# Altium footprint library DIP Component.PcbLib: 327 footprints (part 7 of 21)
Each footprint in its own frame and in the unit in brackets; x right, y up, seen from the top. Pads: shape width x height; smd on the part's side, far side on the other; paste and mask are expansions set on the pad; w line width, h text height; cw(c..) or ccw(c..) is an arc to the next point about the centre after c.
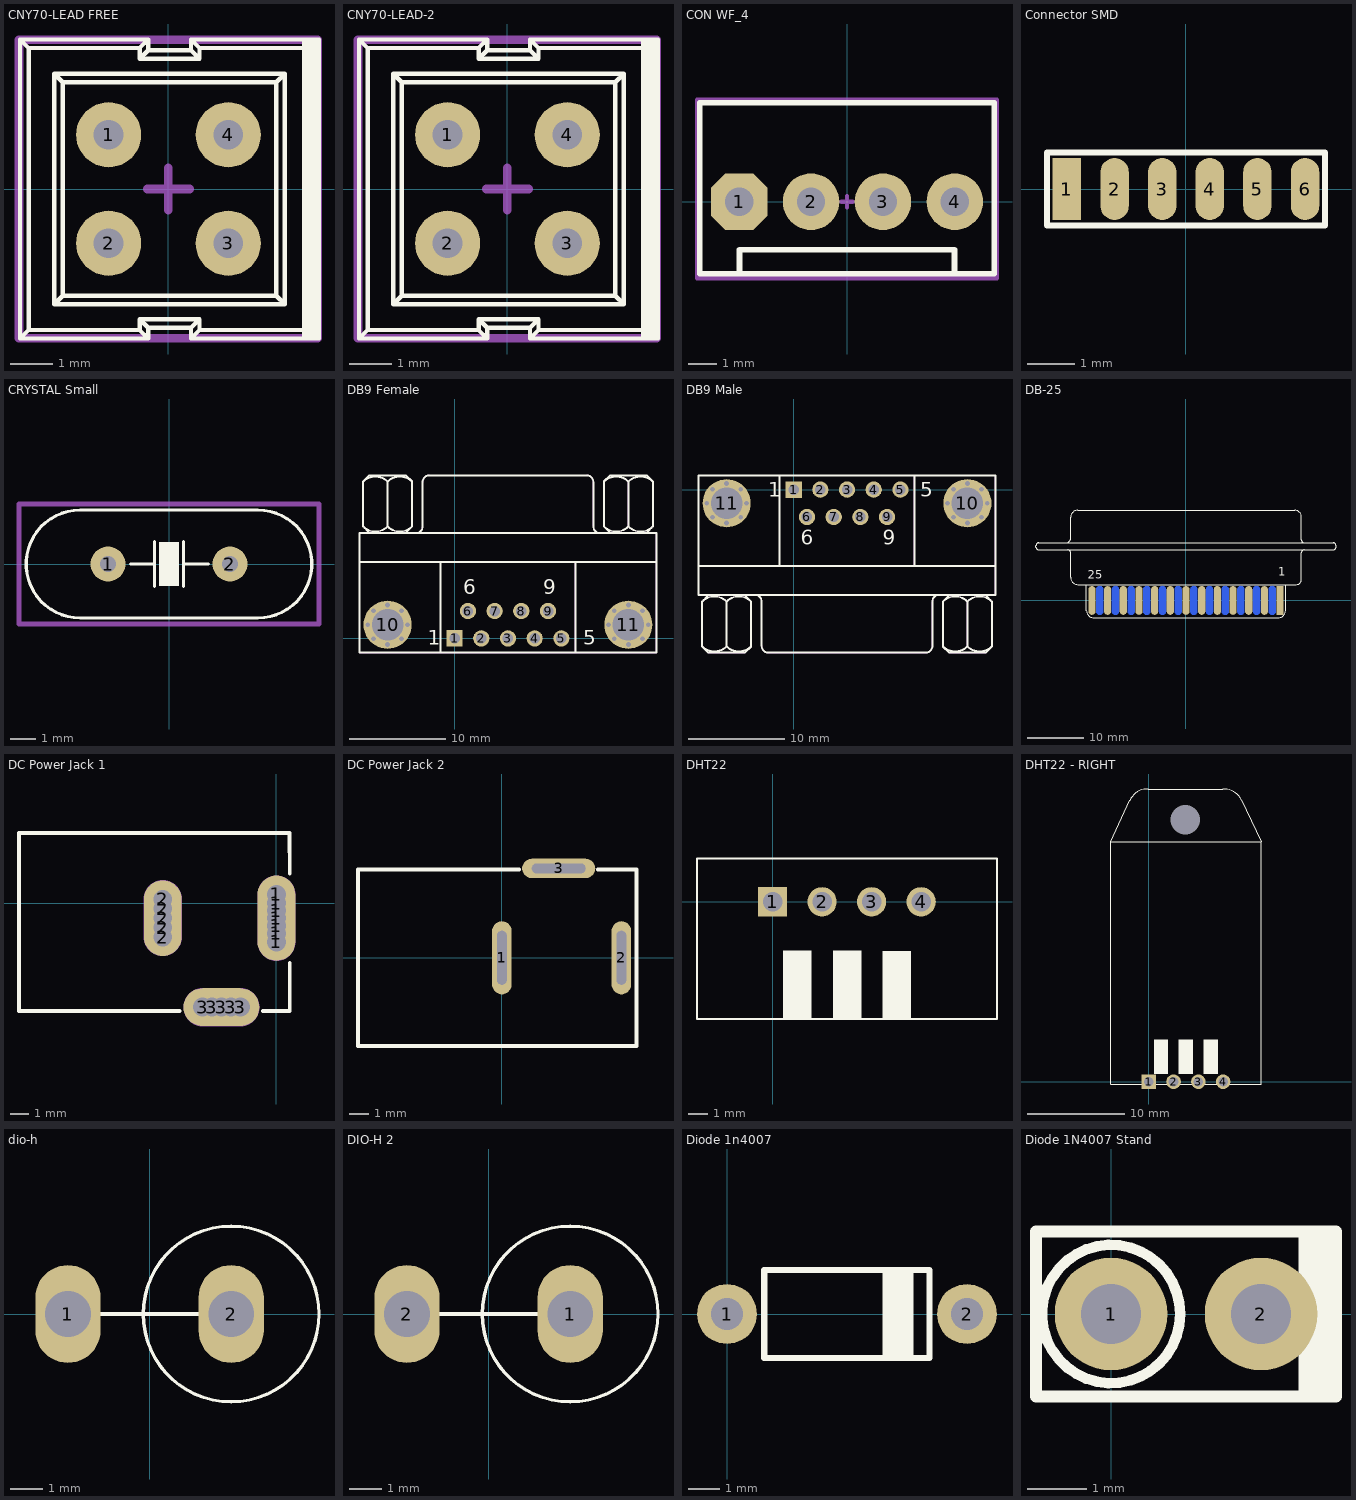
[diagram p6: the footprints below, top view; thin cyan lines are the x and y axes]

## CNY70-LEAD FREE [mm] "Dimensions (L x W x H in mm): 7 x 7 x 6  • Peak operating distance: < 0.5 mm DESIGNER ABBAS BASEREH"
height 6
pads (4):
  round 1.524 hole 0.7: 1(-1.4,1.27) 2(-1.4,-1.27) 3(1.4,-1.27) 4(1.4,1.27)
Top Overlay:
  rectangle: 3.125,-3.5 3.525,3.5
  lines w0.1: -3.475,-3.5 -0.475,-3.5 ; -3.475,-3.5 -3.275,-3.3 ; -3.475,-3.5 -3.475,3.5 ; -3.475,3.5 -3.275,3.3 ; -3.475,3.5 -0.475,3.5 ; -3.275,-3.3 -0.675,-3.3 ; -3.275,-3.3 -3.275,3.3 ; -3.275,3.3 -0.675,3.3 ; -2.675,-2.7 -2.475,-2.5 ; -2.675,-2.7 -2.675,2.7 ; -2.675,-2.7 2.725,-2.7 ; -2.675,2.7 -2.475,2.5 ; -2.675,2.7 2.725,2.7 ; -2.475,-2.5 -2.475,2.5 ; -2.475,-2.5 2.525,-2.5 ; -2.475,2.5 2.525,2.5 ; -0.675,-3.3 -0.675,-3.05 ; -0.675,-3.3 -0.475,-3.5 ; -0.675,-3.05 0.725,-3.05 ; -0.675,-3.05 -0.475,-3.25 ; -0.675,3.05 0.725,3.05 ; -0.675,3.05 -0.675,3.3 ; -0.675,3.05 -0.475,3.25 ; -0.675,3.3 -0.475,3.5 ; -0.475,-3.5 -0.475,-3.25 ; -0.475,-3.25 0.525,-3.25 ; -0.475,3.25 0.525,3.25 ; -0.475,3.25 -0.475,3.5 ; 0.525,-3.5 3.525,-3.5 ; 0.525,-3.5 0.725,-3.3 ; 0.525,-3.5 0.525,-3.25 ; 0.525,-3.25 0.725,-3.05 ; 0.525,3.25 0.725,3.05 ; 0.525,3.25 0.525,3.5 ; 0.525,3.5 0.725,3.3 ; 0.525,3.5 3.525,3.5 ; 0.725,-3.3 3.325,-3.3 ; 0.725,-3.3 0.725,-3.05 ; 0.725,3.05 0.725,3.3 ; 0.725,3.3 3.325,3.3 ; 2.525,-2.5 2.725,-2.7 ; 2.525,-2.5 2.525,2.5 ; 2.525,2.5 2.725,2.7 ; 2.725,-2.7 2.725,2.7 ; 3.325,-3.3 3.525,-3.5 ; 3.325,-3.3 3.325,3.3 ; 3.325,3.3 3.525,3.5 ; 3.525,-3.5 3.525,3.5
Mechanical 15:
  lines w0.2: -0.5,0 0.5,0 ; 0,-0.5 0,0.5 ; -3.5,-3.5 -3.5,3.5 3.5,3.5 3.5,-3.5 -3.5,-3.5
3D body "CNY70.STEP": height 6.01, standoff 0.01, extent -3.475,-3.5 3.525,3.5

## CNY70-LEAD-2 [mm] "Dimensions (L x W x H in mm): 7 x 7 x 6  • Peak operating distance: < 0.5 mm DESIGNER ABBAS BASEREH"
height 6
pads (4):
  round 1.524 hole 0.7: 1(-1.4,1.27) 2(-1.4,-1.27) 3(1.4,-1.27) 4(1.4,1.27)
Top Overlay:
  rectangle: 3.125,-3.5 3.525,3.5
  lines w0.1: -3.475,-3.5 -0.475,-3.5 ; -3.475,-3.5 -3.275,-3.3 ; -3.475,-3.5 -3.475,3.5 ; -3.475,3.5 -3.275,3.3 ; -3.475,3.5 -0.475,3.5 ; -3.275,-3.3 -0.675,-3.3 ; -3.275,-3.3 -3.275,3.3 ; -3.275,3.3 -0.675,3.3 ; -2.675,-2.7 -2.475,-2.5 ; -2.675,-2.7 -2.675,2.7 ; -2.675,-2.7 2.725,-2.7 ; -2.675,2.7 -2.475,2.5 ; -2.675,2.7 2.725,2.7 ; -2.475,-2.5 -2.475,2.5 ; -2.475,-2.5 2.525,-2.5 ; -2.475,2.5 2.525,2.5 ; -0.675,-3.3 -0.675,-3.05 ; -0.675,-3.3 -0.475,-3.5 ; -0.675,-3.05 0.725,-3.05 ; -0.675,-3.05 -0.475,-3.25 ; -0.675,3.05 0.725,3.05 ; -0.675,3.05 -0.675,3.3 ; -0.675,3.05 -0.475,3.25 ; -0.675,3.3 -0.475,3.5 ; -0.475,-3.5 -0.475,-3.25 ; -0.475,-3.25 0.525,-3.25 ; -0.475,3.25 0.525,3.25 ; -0.475,3.25 -0.475,3.5 ; 0.525,-3.5 3.525,-3.5 ; 0.525,-3.5 0.725,-3.3 ; 0.525,-3.5 0.525,-3.25 ; 0.525,-3.25 0.725,-3.05 ; 0.525,3.25 0.725,3.05 ; 0.525,3.25 0.525,3.5 ; 0.525,3.5 0.725,3.3 ; 0.525,3.5 3.525,3.5 ; 0.725,-3.3 3.325,-3.3 ; 0.725,-3.3 0.725,-3.05 ; 0.725,3.05 0.725,3.3 ; 0.725,3.3 3.325,3.3 ; 2.525,-2.5 2.725,-2.7 ; 2.525,-2.5 2.525,2.5 ; 2.525,2.5 2.725,2.7 ; 2.725,-2.7 2.725,2.7 ; 3.325,-3.3 3.525,-3.5 ; 3.325,-3.3 3.325,3.3 ; 3.325,3.3 3.525,3.5 ; 3.525,-3.5 3.525,3.5
Mechanical 15:
  lines w0.2: -0.5,0 0.5,0 ; 0,-0.5 0,0.5 ; -3.5,-3.5 -3.5,3.5 3.5,3.5 3.5,-3.5 -3.5,-3.5
3D body "CNY70.SLDPRT": height 6, standoff -6.75, extent -3.15,-3.15 3.15,3.15

## CON WF_4 [mm] "DS1070  WF, Cvilux CI31 pitch 2.54mm-Designer Abbas Basereh"
pads (4):
  oct 2x2 hole 1: 1(-3.81,0)
  round 2 hole 1: 2(-1.27,0) 3(1.27,0) 4(3.81,0)
Top Overlay:
  lines w0.2: -3.8,-2.548 -3.8,-1.7 3.8,-1.7 3.8,-2.548 ; -5.2,-2.548 -5.2,3.5 5.2,3.5 5.2,-2.548 -5.2,-2.548
Mechanical 15:
  lines w0.15: -0.2,0 0.2,0 ; 0,-0.2 0,0.2 ; -5.3,-2.7 -5.3,3.6 5.3,3.6 5.3,-2.7 -5.3,-2.7
3D body "User Library-CI31_4.step": height 11.56, standoff -3.24, extent -5.08,-2.402 5.08,3.398

## Connector SMD [mm]
pads (6):
  rect 0.6x1.3 smd: 1(-2.5,0)
  oval 0.6x1.3 smd: 2(-1.5,0) 3(-0.5,0) 4(0.5,0) 5(1.5,0) 6(2.5,0)
Top Overlay:
  lines w0.127: -2.921,-0.762 -2.921,0.762 2.921,0.762 2.921,-0.762 -2.921,-0.762

## CRYSTAL Small [mil] "DESIGNER ABBAS BASEREH"
height 157.48
pads (2):
  round 55 hole 25: 1(-96.06,0) 2(96.06,0)
Top Overlay:
  rectangle: -15.75,-35 15.75,35
  lines w5: -60.87,0 -22.87,0 ; -22.87,-35 -22.87,35 ; 22.87,-35 22.87,35 ; 22.87,0 61.87,0 ; -140,-85 cw(c-140,0) -140,85 140,85 cw(c140,0) 140,-85 -140,-85
Mechanical 15:
  lines w7.87: -7.87,0 7.87,0 ; 0,-7.87 0,7.87 ; -236.22,-94.49 236.22,-94.49 236.22,94.49 -236.22,94.49 -236.22,-94.49
3D body "Crystal-3.8mm.STEP": height 142.13, standoff -76.77, extent -226.37,-88.58 226.38,88.59

## DB9 Female [mm] "Connector; D Subminiature AMPLIMITE 2000; 9 Position; Right Angle"
height 12.75
pads (27):
  rect 1.69x1.69 hole 1.09: 1(0,0)
  round 1.69 hole 1.09: 2(2.77,0) 3(5.54,0) 4(8.31,0) 5(11.08,0) 6(1.385,2.84) 7(4.155,2.84) 8(6.925,2.84) 9(9.695,2.84)
  round 0.8 hole 0.5: 10(-9.015,1.42) 10(-8.412,-0.037) 10(-8.412,2.877) 10(-6.955,-0.64) 10(-6.955,3.48) 10(-5.498,-0.037) 10(-5.498,2.877) 10(-4.895,1.42) 11(15.975,1.42) 11(16.578,-0.037) 11(16.578,2.877) 11(18.035,-0.64) 11(18.035,3.48) 11(19.492,-0.037) 11(19.492,2.877) 11(20.095,1.42)
  round 5 hole 3.26: 10(-6.955,1.42) 11(18.035,1.42)
Top Overlay:
  lines w0.2: -9.86,7.92 20.94,7.92 ; -9.498,16.27 -9.498,11.619 -8.863,10.984 ; -9.498,16.285 -8.863,16.92 -5.053,16.92 -4.418,16.285 ; -6.958,11.619 -6.958,16.27 ; -5.053,10.984 -4.418,11.619 -4.418,16.27 ; -4.418,15.006 -4.418,15.218 ; -4.02,10.925 ccw(c-4.02,11.62) -3.325,11.62 -3.325,16.22 ; -3.32,16.225 cw(c-2.625,16.225) -2.625,16.92 13.705,16.92 cw(c13.705,16.225) 14.4,16.225 ; -1.46,-1.48 -1.46,7.92 ; 12.54,-1.48 12.54,7.92 ; 14.405,16.22 14.405,11.62 ccw(c15.1,11.62) 15.1,10.925 ; 15.502,16.27 15.502,11.619 16.137,10.984 ; 15.502,16.285 16.137,16.92 19.947,16.92 20.582,16.285 ; 18.042,11.619 18.042,16.27 ; 19.947,10.984 20.582,11.619 20.582,16.27 ; 20.582,15.006 20.582,15.218 ; -9.86,-1.48 -9.86,10.92 20.94,10.92 20.94,-1.48 -9.86,-1.48
  lines w0.203: -9.5,11.617 ccw(c-8.228,12.889) -6.956,11.617 ; -9.498,16.27 cw(c-8.226,14.998) -6.953,16.27 ; -6.962,16.27 cw(c-5.69,14.998) -4.418,16.27 ; -6.96,11.617 ccw(c-5.688,12.889) -4.416,11.617 ; 15.5,11.617 ccw(c16.772,12.889) 18.044,11.617 ; 15.502,16.27 cw(c16.774,14.998) 18.047,16.27 ; 18.038,16.27 cw(c19.31,14.998) 20.582,16.27 ; 18.04,11.617 ccw(c19.312,12.889) 20.584,11.617
  text "1" at -2.794,-0.64 h1.5
  text "5" at 13.335,-0.64 h1.5
  text "9" at 9.2,4.6 h1.5
  text "6" at 0.9,4.6 h1.5
Mechanical 1:
  lines w0.1: -4.02,10.925 ccw(c-4.02,11.62) -3.325,11.62 ; -3.32,16.225 cw(c-2.625,16.225) -2.625,16.92 ; 13.705,16.92 cw(c13.705,16.225) 14.4,16.225 ; 14.405,11.62 ccw(c15.1,11.62) 15.1,10.925
Mechanical 13:
  lines w0.1: -9.86,7.92 20.94,7.92 ; -9.5,11.617 ccw(c-8.228,12.889) -6.956,11.617 ; -9.498,16.285 -8.863,16.92 -5.053,16.92 -4.418,16.285 ; -8.863,10.984 -9.498,11.619 -9.498,16.27 cw(c-8.226,14.998) -6.953,16.27 ; -6.962,16.27 cw(c-5.69,14.998) -4.418,16.27 -4.418,11.619 -5.053,10.984 ; -6.96,11.617 ccw(c-5.688,12.889) -4.416,11.617 ; -6.958,11.619 -6.958,16.27 ; -4.418,15.006 -4.418,15.218 ; -3.325,11.62 -3.325,16.22 ; -2.625,16.92 13.705,16.92 ; -1.46,-1.48 -1.46,7.92 ; 12.54,-1.48 12.54,7.92 ; 14.405,11.62 14.405,16.22 ; 15.5,11.617 ccw(c16.772,12.889) 18.044,11.617 ; 15.502,16.285 16.137,16.92 19.947,16.92 20.582,16.285 ; 16.137,10.984 15.502,11.619 15.502,16.27 cw(c16.774,14.998) 18.047,16.27 ; 18.038,16.27 cw(c19.31,14.998) 20.582,16.27 20.582,11.619 19.947,10.984 ; 18.04,11.617 ccw(c19.312,12.889) 20.584,11.617 ; 18.042,11.619 18.042,16.27 ; 20.582,15.006 20.582,15.218 ; -9.86,-1.48 -9.86,10.92 20.94,10.92 20.94,-1.48 -9.86,-1.48
3D body "9-PIN_DSUB-1.STEP": height 12.71, standoff -3.01, extent -9.865,-2.034 20.945,17.041

## DB9 Male [mm] "Connector; D Subminiature AMPLIMITE 2000; 9 Position; Right Angle"
height 12.75
pads (27):
  rect 1.69x1.69 hole 1.09: 1(0,0)
  round 1.69 hole 1.09: 2(2.77,0) 3(5.54,0) 4(8.31,0) 5(11.08,0) 6(1.385,-2.84) 7(4.155,-2.84) 8(6.925,-2.84) 9(9.695,-2.84)
  round 0.8 hole 0.5: 10(15.975,-1.42) 10(16.578,-2.877) 10(16.578,0.037) 10(18.035,-3.48) 10(18.035,0.64) 10(19.492,-2.877) 10(19.492,0.037) 10(20.095,-1.42) 11(-9.015,-1.42) 11(-8.412,-2.877) 11(-8.412,0.037) 11(-6.955,-3.48) 11(-6.955,0.64) 11(-5.498,-2.877) 11(-5.498,0.037) 11(-4.895,-1.42)
  round 5 hole 3.26: 10(18.035,-1.42) 11(-6.955,-1.42)
Top Overlay:
  lines w0.2: -9.86,-7.92 20.94,-7.92 ; -9.502,-16.285 -8.867,-16.92 -5.057,-16.92 -4.422,-16.285 ; -9.502,-16.27 -9.502,-11.619 -8.867,-10.984 ; -9.502,-15.218 -9.502,-15.006 ; -6.962,-16.27 -6.962,-11.619 ; -5.057,-10.984 -4.422,-11.619 -4.422,-16.27 ; -4.02,-10.925 cw(c-4.02,-11.62) -3.325,-11.62 -3.325,-16.22 ; -3.32,-16.225 ccw(c-2.625,-16.225) -2.625,-16.92 13.705,-16.92 ccw(c13.705,-16.225) 14.4,-16.225 ; -1.46,-7.92 -1.46,1.48 ; 12.54,-7.92 12.54,1.48 ; 14.405,-16.22 14.405,-11.62 cw(c15.1,-11.62) 15.1,-10.925 ; 15.498,-16.285 16.133,-16.92 19.943,-16.92 20.578,-16.285 ; 15.498,-16.27 15.498,-11.619 16.133,-10.984 ; 15.498,-15.218 15.498,-15.006 ; 18.038,-16.27 18.038,-11.619 ; 19.943,-10.984 20.578,-11.619 20.578,-16.27 ; -9.86,-10.92 -9.86,1.48 20.94,1.48 20.94,-10.92 -9.86,-10.92
  lines w0.203: -9.504,-11.617 cw(c-8.232,-12.889) -6.96,-11.617 ; -9.502,-16.27 ccw(c-8.23,-14.998) -6.958,-16.27 ; -6.967,-16.27 ccw(c-5.694,-14.998) -4.422,-16.27 ; -6.964,-11.617 cw(c-5.692,-12.889) -4.42,-11.617 ; 15.496,-11.617 cw(c16.768,-12.889) 18.04,-11.617 ; 15.498,-16.27 ccw(c16.77,-14.998) 18.042,-16.27 ; 18.033,-16.27 ccw(c19.306,-14.998) 20.578,-16.27 ; 18.036,-11.617 cw(c19.308,-12.889) 20.58,-11.617
  text "6" at 0.74,-5.72 h1.5
  text "1" at -2.625,-0.72 h1.5
  text "5" at 13.14,-0.72 h1.5
  text "9" at 9.24,-5.72 h1.5
Mechanical 13:
  lines w0.1: -9.86,-7.92 20.94,-7.92 ; -9.504,-11.617 cw(c-8.232,-12.889) -6.96,-11.617 ; -9.502,-16.285 -8.867,-16.92 -5.057,-16.92 -4.422,-16.285 ; -9.502,-15.218 -9.502,-15.006 ; -8.867,-10.984 -9.502,-11.619 -9.502,-16.27 ccw(c-8.23,-14.998) -6.958,-16.27 ; -6.967,-16.27 ccw(c-5.694,-14.998) -4.422,-16.27 -4.422,-11.619 -5.057,-10.984 ; -6.964,-11.617 cw(c-5.692,-12.889) -4.42,-11.617 ; -6.962,-16.27 -6.962,-11.619 ; -4.02,-10.925 cw(c-4.02,-11.62) -3.325,-11.62 -3.325,-16.22 ; -3.32,-16.225 ccw(c-2.625,-16.225) -2.625,-16.92 13.705,-16.92 ccw(c13.705,-16.225) 14.4,-16.225 ; -1.46,-7.92 -1.46,1.48 ; 12.54,-7.92 12.54,1.48 ; 14.405,-16.22 14.405,-11.62 cw(c15.1,-11.62) 15.1,-10.925 ; 15.496,-11.617 cw(c16.768,-12.889) 18.04,-11.617 ; 15.498,-16.285 16.133,-16.92 19.943,-16.92 20.578,-16.285 ; 15.498,-15.218 15.498,-15.006 ; 16.133,-10.984 15.498,-11.619 15.498,-16.27 ccw(c16.77,-14.998) 18.042,-16.27 ; 18.033,-16.27 ccw(c19.306,-14.998) 20.578,-16.27 20.578,-11.619 19.943,-10.984 ; 18.036,-11.617 cw(c19.308,-12.889) 20.58,-11.617 ; 18.038,-16.27 18.038,-11.619 ; -9.86,-10.92 -9.86,1.48 20.94,1.48 20.94,-10.92 -9.86,-10.92
3D body "9-PIN_DSUB.STEP": height 12.77, standoff -2.95, extent -9.943,-17.608 20.943,2.077

## DB-25 [mm] "Connector D25 Male - SMD Design"
pads (25):
  rect 1.27x5.08 smd: 1(16.566,0)
  oval 1.27x5.08 smd: 2(13.805,0) 3(11.044,0) 4(8.283,0) 5(5.522,0) 6(2.761,0) 7(0,0) 8(-2.761,0) 9(-5.522,0) 10(-8.283,0) 11(-11.044,0) 12(-13.805,0) 13(-16.566,0)
  oval 1.27x5.08 smd far side: 14(15.186,0) 15(12.425,0) 16(9.664,0) 17(6.903,0) 18(4.142,0) 19(1.381,0) 20(-1.381,0) 21(-4.142,0) 22(-6.902,0) 23(-9.663,0) 24(-12.424,0) 25(-15.185,0)
Top Overlay:
  lines w0.127: -21.59,10.16 22.86,10.16 ; -21.336,8.89 21.59,8.89 ; -17.526,2.794 -17.526,-1.778 ccw(c-16.256,-1.778) -16.256,-3.048 16.256,-3.048 ccw(c16.256,-1.778) 17.526,-1.778 17.526,2.794 ; -26.416,9.398 ccw(c-25.908,9.398) -25.908,8.89 -20.828,8.89 cw(c-20.828,8.382) -20.32,8.382 -20.32,4.064 ccw(c-19.05,4.064) -19.05,2.794 19.453,2.794 ccw(c19.453,3.661) 20.32,3.661 20.32,8.382 cw(c20.828,8.382) 20.828,8.89 25.908,8.89 ccw(c25.908,9.398) 26.416,9.398 26.416,9.652 ccw(c25.908,9.652) 25.908,10.16 20.828,10.16 cw(c20.828,10.668) 20.32,10.668 20.32,14.732 ccw(c19.177,14.732) 19.177,15.875 -19.05,15.875 ccw(c-19.05,14.605) -20.32,14.605 -20.32,10.922 cw(c-21.082,10.922) -21.082,10.16 -25.908,10.16 ccw(c-25.908,9.652) -26.416,9.652 -26.416,9.398
  text "25" at -17.272,3.81 h1.5
  text "1" at 16.256,4.318 h1.5
3D body "SW3dPS-DB25plug_straight.STEP": height 6.97, standoff -5.57, extent -26.518,-1.422 26.518,15.875

## DC Power Jack 1 [mm] "Power Adaptor Jack"
pads (17):
  round 1.5 hole 1: 1(0,-2.05) 1(0,-1.6) 1(0,-1.2) 1(0,-0.4) 1(0,0) 1(0,0.45) 2(-6,-1.8) 2(-6,0.2) 2(-6,-1.3) 2(-6,-0.3) 3(-3.9,-5.5) 3(-3.4,-5.5) 3(-2.4,-5.5) 3(-1.9,-5.5)
  oval 2x4.5 hole 1: 1(0,-0.8)
  oval 2x4 hole 1: 2(-6,-0.8)
  oval 4x2 hole 1: 3(-2.9,-5.5)
Top Overlay:
  lines w0.2: -5.1,-5.7 -13.59,-5.7 -13.59,3.7 0.7,3.7 0.7,1.55 ; -0.7,-5.7 0.7,-5.7 0.7,-3.15
Mechanical 1:
  lines w1: -6,-1.8 -6,0.2 ; -3.9,-5.5 -1.9,-5.5 ; 0,-2.05 0,0.45
Mechanical 2:
  lines w2.016: -6,-1.8 -6,0.2 ; -3.9,-5.5 -1.9,-5.5 ; 0,-2.05 0,0.45
3D body "User Library-PJ-002AH.STEP": height 11.05, standoff -3.45, extent -13.68,-5.735 0.72,3.665

## DC Power Jack 2 [mil] "DC Power Jack. Center Pin 2.5mm. Diameter: 5.7mm"
pads (3):
  oval 40x150 hole 20 slot 110 at 90 deg mask+1: 1(0,0) 2(244.96,0)
  oval 150x40 hole 20 slot 110 at 0 deg mask+1: 3(116.46,183.07)
Top Overlay:
  lines w7.87: 35.43,181.1 -294.88,181.1 -294.88,-181.1 275.98,-181.1 275.98,181.1 196.85,181.1
3D body "User Library-DC POWER JACK.step": height 440, standoff -141.73, extent -294.88,-182.52 275.12,190.39

## DHT22 [mm] "Temperature & Humidity Sensor"
pads (4):
  rect 1.5x1.5 hole 1: 1(0,0)
  round 1.5 hole 1: 2(2.54,0) 3(5.08,0) 4(7.62,0)
Top Overlay:
  rectangle: 5.63,-6.05 7.09,-2.52
  rectangle: 3.09,-6.03 4.55,-2.5
  rectangle: 0.53,-6.03 1.99,-2.5
  lines w0.1: -3.878,2.22 11.512,2.22 11.512,-6.01 ; -3.878,2.23 -3.878,-6.02 11.502,-6.02
3D body "User Library-DHT22.step": height 29.1, standoff -4.5, extent -3.728,-5.91 11.372,2.1

## DHT22 - RIGHT [mm] "Temperature & Humidity Sensor"
pads (5):
  round 0 hole 3: 0(3.73,26.84)
  rect 1.5x1.5 hole 1: 1(0,0)
  round 1.5 hole 1: 2(2.54,0) 3(5.08,0) 4(7.62,0)
Top Overlay:
  rectangle: 5.63,0.79 7.09,4.32
  rectangle: 3.07,0.79 4.53,4.32
  rectangle: 0.53,0.79 1.99,4.32
  lines w0.1: -3.88,24.61 -1.94,28.82 ; -1.942,28.812 cw(c-0.165,28.065) -0.07,29.99 7.59,29.99 ; 7.58,29.99 cw(c7.684,27.978) 9.48,28.89 ; 9.48,28.88 11.52,24.578 11.52,-0.28 -3.89,-0.28 -3.89,24.6 11.5,24.6
3D body "User Library-DHT22_HOR.step": height 8.01, standoff -1.25, extent -3.74,-0.17 11.36,29.93

## dio-h [mm] "dio-hor"
pads (2):
  oval 2x3 hole 1.4: 1(-2.5,0) 2(2.5,0)
Top Overlay:
  circle w0.1: c2.5,0 r2.693
  lines w0.127: -2.5,0 2.5,0

## DIO-H 2 [mm]
pads (2):
  oval 2x3 hole 1.4: 1(2.5,0) 2(-2.5,0)
Top Overlay:
  circle w0.1: c2.5,0 r2.693
  lines w0.127: -2.5,0 2.5,0

## Diode 1n4007 [mil] "Diode 1N4007 : 1.0A RECTIFIER Case: DO-41 Case Material: Molded Plastic Terminals: Finish - Bright Tin Weight: 0.30 grams"
pads (2):
  round 75 hole 40: 1(0,0) 2(300,0)
Top Overlay:
  rectangle: 194.09,-55 232.99,55
  lines w7.87: 46.46,-55 253.15,-55 253.15,55 46.46,55 46.46,-55
3D body "1N4007.STEP": height 131.24, standoff -39.37, extent -16,-52.5 315,52.5

## Diode 1N4007 Stand [mil]
pads (2):
  round 75 hole 40: 1(0,0) 2(100,0)
Top Overlay:
  circle w7: c0,0 r46.1
  rectangle: 125,-52 150,53
  lines w7.87: -50,-55 -50,55 150,55 150,-55 -50,-55
3D body "1N4007_Stand.STEP": height 291.09, standoff -39.37, extent -53,-52 115,53